# Altium footprint library Calipso V2.0 REV2.0 (new origin)1.PcbLib: 45 footprints (part 1 of 3)
Each footprint in its own frame and in the unit in brackets; x right, y up, seen from the top. Pads: shape width x height; smd on the part's side, far side on the other; paste and mask are expansions set on the pad; w line width, h text height; cw(c..) or ccw(c..) is an arc to the next point about the centre after c.
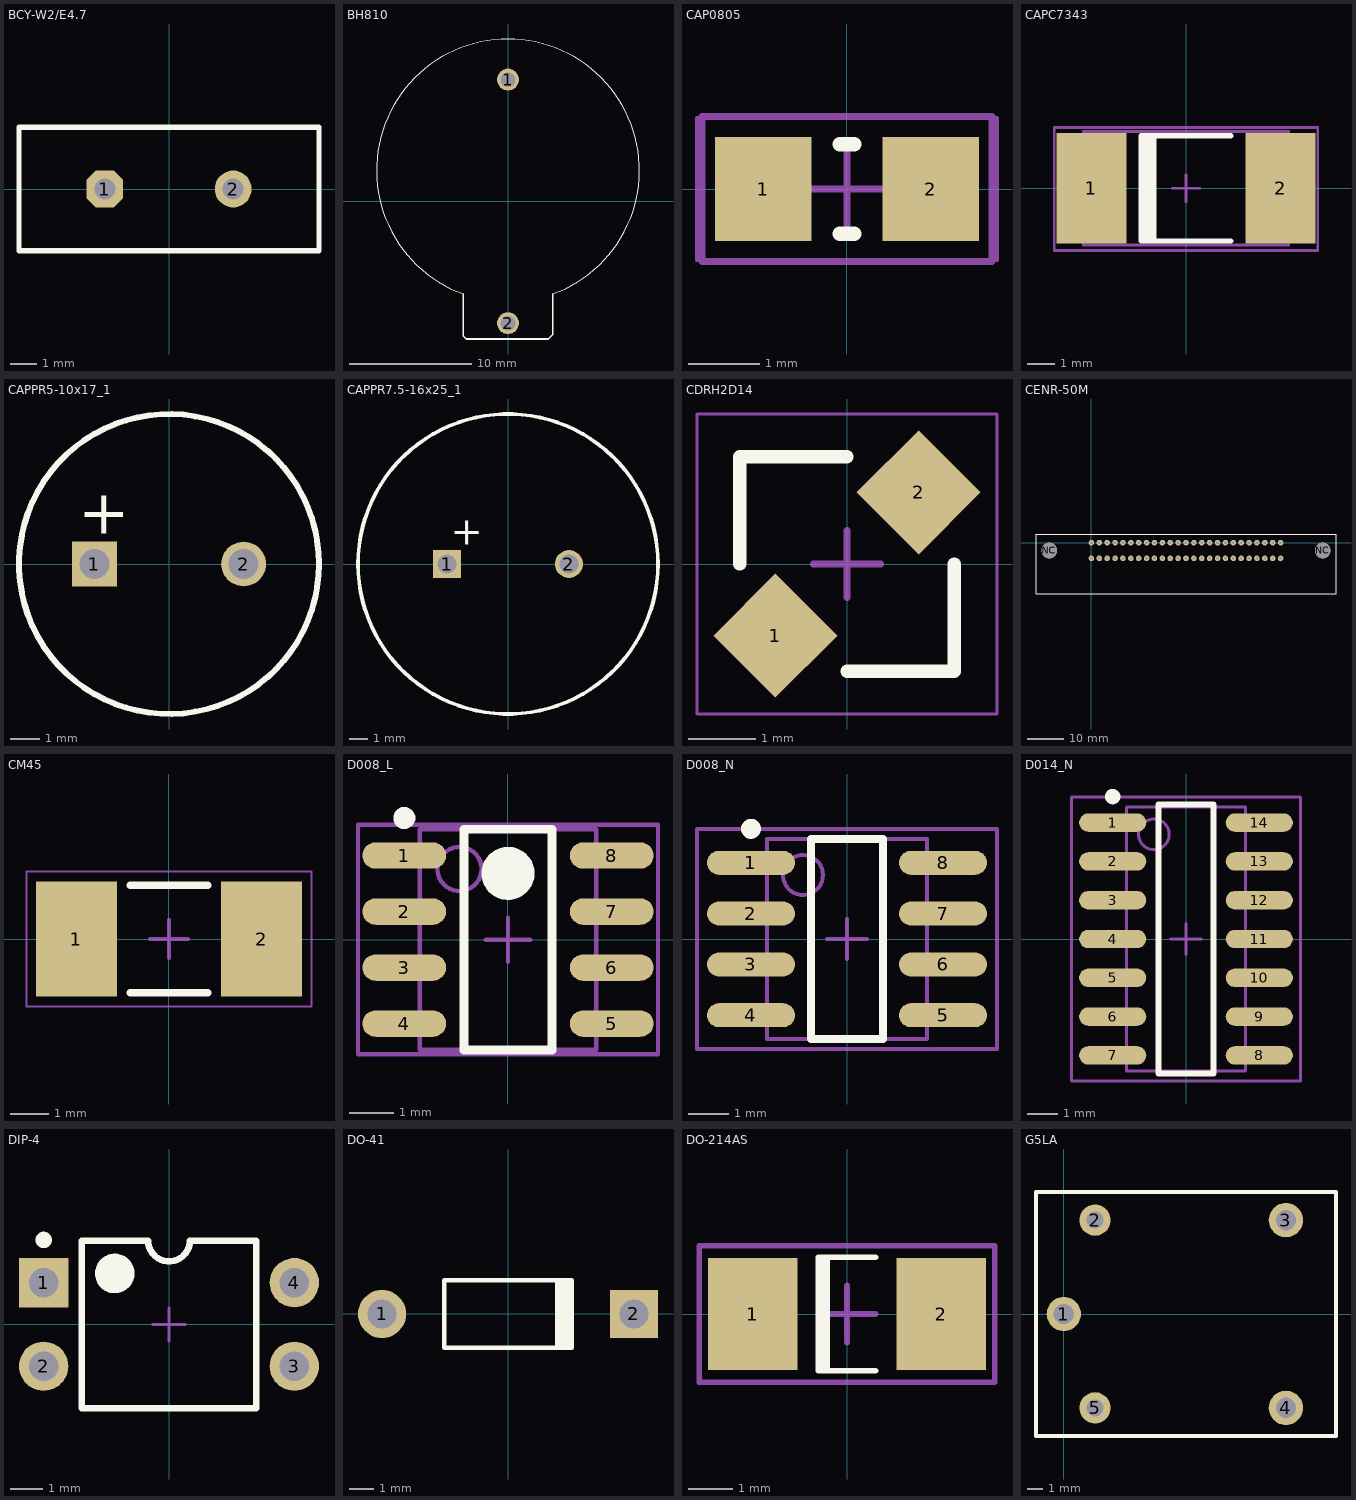
[diagram p0: the footprints below, top view; thin cyan lines are the x and y axes]

## BCY-W2/E4.7 [mm]
pads (2):
  oct 1.4x1.4 hole 0.8: 1(-2.44,0)
  round 1.4 hole 0.8: 2(2.44,0)
Top Overlay:
  lines w0.2: -5.7,-2.35 -5.7,2.35 5.7,2.35 5.7,-2.35 -5.7,-2.35
3D body "HC-49_LT_THT.STEP": height 3.6, standoff -1.99, extent -5.675,-2.325 5.675,2.325

## BH810 [mm]
pads (2):
  round 1.8 hole 1.2: 1(0,10) 2(0,-10)
Top Overlay:
  lines w0.1: -3.692,-7.604 cw(c0,2.54) 3.692,-7.604
  lines w0.127: -3.692,-7.604 -3.692,-11.04 -3.429,-11.303 3.302,-11.303 3.692,-10.913 3.692,-7.604
3D body "User Library-CR2032_HOR_HOLD.STEP": height 8.5, standoff -4, extent -11,-11.214 11,13.286

## CAP0805 [mm]
pads (2):
  rect 1.35x1.45 smd: 1(-1.175,0) 2(1.175,0)
Top Overlay:
  lines w0.2: -0.1,-0.625 0.1,-0.625 ; -0.1,0.625 0.1,0.625
Mechanical 13:
  lines w0.1: -2.032,-1.016 2.032,-1.016 2.032,1.016 -2.032,1.016 -2.032,-1.016
Mechanical 15:
  lines w0.05: -2.1,-1 2.1,-1 2.1,1 -2.1,1 -2.1,-1
  lines w0.1: -0.5,0 0.5,0 ; 0,-0.5 0,0.5
3D body "CAP-0805.STEP": height 0.3, standoff -0.3, extent -1,-0.625 1,0.625

## CAPC7343 [mm]
pads (2):
  rect 2.6x4.1 smd: 1(-3.5,0) 2(3.5,0)
Top Overlay:
  rectangle: -1.65,-1.95 -1.1,1.95
  lines w0.2: 1.65,-1.95 -1.65,-1.95 -1.65,1.95 1.65,1.95
Mechanical 13:
  lines w0.1: -3.8,-2.1 3.8,-2.1 3.8,2.1 -3.8,2.1 -3.8,-2.1
Mechanical 15:
  lines w0.1: -0.5,0 0.5,0 ; 0,-0.5 0,0.5 ; -4.875,-2.3 4.875,-2.3 4.875,2.25 -4.875,2.25 -4.875,-2.3
3D body "User Library-CAP_TANT_7343-31.STEP": height 3.1, standoff 0, extent -3.8,-2.3 3.8,2.3

## CAPPR5-10x17_1 [mm]
pads (2):
  rect 1.5x1.5 hole 1: 1(-2.5,0)
  round 1.5 hole 1: 2(2.5,0)
Top Overlay:
  circle w0.2: c0,0 r5.025
  text "+" at -3.048,1.016 h1.5
3D body "SW3dPS-Cap electro 10x12.5x5.0mm.STEP": height 13.03, standoff -3.48, extent -5.025,-5.001 5.026,5.05

## CAPPR7.5-16x25_1 [mm]
pads (2):
  rect 1.5x1.5 hole 1: 1(-3.25,0)
  round 1.5 hole 1: 2(3.25,0)
Top Overlay:
  circle w0.2: c0,0 r8
  text "+" at -3.048,1.016 h1.5

## CDRH2D14 [mm]
pads (2):
  rect 1.3x1.3 smd rot 135: 1(-1.061,-1.061) 2(1.061,1.061)
Top Overlay:
  lines w0.2: -1.587,0 -1.587,1.587 0,1.587 ; 0,-1.587 1.587,-1.587 1.587,0
Mechanical 15:
  lines w0.05: -2.222,-2.222 -2.222,2.222 2.222,2.222 2.222,-2.222 -2.222,-2.222
  lines w0.1: -0.5,0 0.5,0 ; 0,-0.5 0,0.5
3D body "cdrh2d18.step": height 2, standoff 0, extent -1.539,-1.538 1.538,1.538

## CENR-50M [mil]
pads (52):
  round 60 hole 30: 1(0,0) 2(85.04,0) 3(170.08,0) 4(255.12,0) 5(340.16,0) 6(425.2,0) 7(510.24,0) 8(595.28,0) 9(680.32,0) 10(765.35,0) 11(850.39,0) 12(935.43,0) 13(1020.47,0) 14(1105.51,0) 15(1190.55,0) 16(1275.59,0) 17(1360.63,0) 18(1445.67,0) 19(1530.71,0) 20(1615.75,0) 21(1700.79,0) 22(1785.83,0) 23(1870.87,0) 24(1955.91,0) 25(2040.94,0) 26(0,-168.9) 27(85.04,-168.9) 28(170.08,-168.9) 29(255.12,-168.9) 30(340.16,-168.9) 31(425.2,-168.9) 32(510.24,-168.9) 33(595.28,-168.9) 34(680.32,-168.9) 35(765.35,-168.9) 36(850.39,-168.9) 37(935.43,-168.9) 38(1020.47,-168.9) 39(1105.51,-168.9) 40(1190.55,-168.9) 41(1275.59,-168.9) 42(1360.63,-168.9) 43(1445.67,-168.9) 44(1530.71,-168.9) 45(1615.75,-168.9) 46(1700.79,-168.9) 47(1785.83,-168.9) 48(1870.87,-168.9) 49(1955.91,-168.9) 50(2040.94,-168.9)
  round 168.9 hole 168.9 unplated: NC(-453.94,-84.45) NC(2494.88,-84.45)
Top Overlay:
  lines w5: -597.64,-552.95 -597.64,92.72 2494.88,92.72 2638.58,92.72 2638.58,-84.45 2638.58,-552.95 2494.88,-552.95 -597.64,-552.95
3D body "14267.STEP": height 610.72, standoff -187.18, extent -720.31,-1547.87 2761.25,90.35

## CM45 [mm]
pads (2):
  rect 2.1x2.99 smd: 1(-2.405,0) 2(2.405,0)
Top Overlay:
  lines w0.2: -1,-1.395 1,-1.395 ; -1,1.395 1,1.395
Mechanical 15:
  lines w0.05: -3.7,-1.75 -3.7,1.75 3.7,1.75 3.7,-1.75 -3.7,-1.75
  lines w0.1: -0.5,0 0.5,0 ; 0,-0.5 0,0.5
3D body "CM45.step": height 3.2, standoff 0, extent -2.25,-1.587 2.25,1.612

## D008_L [mm]
pads (8):
  oval 1.9x0.6 smd: 1(-2.35,1.905) 2(-2.35,0.635) 3(-2.35,-0.635) 4(-2.35,-1.905) 5(2.35,-1.905) 6(2.35,-0.635) 7(2.35,0.635) 8(2.35,1.905)
Top Overlay:
  circle w0.25: c-2.35,2.755 r0.125
  circle w0.6: c0,1.5 r0.3
  lines w0.2: -1,-2.5 -1,2.5 1,2.5 1,-2.5 -1,-2.5
Mechanical 13:
  circle w0.1: c-1.1,1.6 r0.5
  lines w0.1: -2,-2.5 -2,2.5 2,2.5 2,-2.5 -2,-2.5
Mechanical 15:
  lines w0.1: -0.5,0 0.5,0 ; 0,-0.5 0,0.5 ; -3.4,-2.6 -3.4,2.6 3.4,2.6 3.4,-2.6 -3.4,-2.6
3D body: height 1.75, standoff 0, extent -2,-2.5 2,2.5

## D008_N [mm]
pads (8):
  oval 2.2x0.6 smd: 1(-2.4,1.905) 2(-2.4,0.635) 3(-2.4,-0.635) 4(-2.4,-1.905) 5(2.4,-1.905) 6(2.4,-0.635) 7(2.4,0.635) 8(2.4,1.905)
Top Overlay:
  circle w0.25: c-2.4,2.755 r0.125
  lines w0.2: -0.9,-2.5 0.9,-2.5 0.9,2.5 -0.9,2.5 -0.9,-2.5
Mechanical 13:
  circle w0.1: c-1.1,1.6 r0.5
  lines w0.1: -2,-2.5 2,-2.5 2,2.5 -2,2.5 -2,-2.5
Mechanical 15:
  lines w0.1: -0.5,0 0.5,0 ; 0,-0.5 0,0.5 ; -3.75,-2.75 3.75,-2.75 3.75,2.75 -3.75,2.75 -3.75,-2.75
3D body: height 1.75, standoff 0, extent -2,-2.5 2,2.5

## D014_N [mm]
pads (14):
  oval 2.2x0.6 smd: 1(-2.4,3.81) 2(-2.4,2.54) 3(-2.4,1.27) 4(-2.4,0) 5(-2.4,-1.27) 6(-2.4,-2.54) 7(-2.4,-3.81) 8(2.4,-3.81) 9(2.4,-2.54) 10(2.4,-1.27) 11(2.4,0) 12(2.4,1.27) 13(2.4,2.54) 14(2.4,3.81)
Top Overlay:
  circle w0.25: c-2.4,4.66 r0.125
  lines w0.2: -0.9,-4.4 -0.9,4.4 0.9,4.4 0.9,-4.4 -0.9,-4.4
Mechanical 13:
  circle w0.1: c-1.05,3.425 r0.5
  lines w0.1: -1.95,-4.325 -1.95,4.325 1.95,4.325 1.95,-4.325 -1.95,-4.325
Mechanical 15:
  lines w0.1: -0.5,0 0.5,0 ; 0,-0.5 0,0.5 ; -3.75,-4.65 -3.75,4.65 3.75,4.65 3.75,-4.65 -3.75,-4.65
3D body "so14.STEP": height 1.7, standoff 0, extent -3,-4.4 3,4.4

## DIP-4 [mm]
pads (4):
  rect 1.5x1.5 hole 0.9: 1(-3.81,1.27)
  round 1.5 hole 0.9: 2(-3.81,-1.27) 3(3.81,-1.27) 4(3.81,1.27)
Top Overlay:
  circle w0.6: c-1.65,1.55 r0.3
  circle w0.25: c-3.81,2.57 r0.125
  lines w0.2: -2.65,-2.55 2.65,-2.55 2.65,2.55 0.635,2.55 cw(c0,2.55) -0.635,2.55 -2.65,2.55 -2.65,-2.55
Mechanical 15:
  lines w0.1: -0.5,0 0.5,0 ; 0,-0.5 0,0.5
3D body "User Library-DIP4-7_62-2_54.STEP": height 4.3, standoff -2.7, extent -3.94,-2.295 3.94,2.295

## DO-41 [mm]
pads (2):
  round 2 hole 1.2: 1(-5.23,0)
  rect 2x2 hole 1.2: 2(5.23,0)
Top Overlay:
  rectangle: 1.95,-1.4 2.75,1.4
  lines w0.2: 2.65,-1.4 -2.65,-1.4 -2.65,1.4 2.65,1.4

## DO-214AS [mm]
pads (2):
  rect 2x2.5 smd: 1(-2.1,0) 2(2.1,0)
Top Overlay:
  rectangle: -0.635,-1.27 -0.381,1.27
  lines w0.127: 0.635,-1.27 -0.635,-1.27 -0.635,1.27 0.635,1.27
Mechanical 13:
  lines w0.1: 1.524,0 2.794,0 ; 2.159,-0.635 2.159,0.635 ; -3.302,-1.524 3.302,-1.524 3.302,1.524 -3.302,1.524 -3.302,-1.524
Mechanical 15:
  lines w0.127: -0.635,0 0.635,0 ; 0,-0.635 0,0.635 ; -3.302,-1.524 3.302,-1.524 3.302,1.524 -3.302,1.524 -3.302,-1.524
3D body "User Library-DO-214AC(SMA).STEP": height 2.3, standoff 0.01, extent -2.743,-1.397 2.743,1.397

## G5LA [mm]
pads (5):
  round 2.2 hole 1.3: 1(0,0) 3(14.2,6) 4(14.2,-6)
  round 2 hole 1.1: 2(2,6) 5(2,-6)
Top Overlay:
  lines w0.254: -1.778,-7.8 15.621,-7.8 17.399,-7.8 17.399,6.604 17.399,7.8 -1.778,7.8 -1.778,-7.8
3D body "User Library-RELE.STEP": height 15, standoff -3, extent -1.593,-7.95 17.907,7.95